# Altium footprint library PcbLib1.PcbLib: 209 footprints (part 5 of 14)
Each footprint in its own frame and in the unit in brackets; x right, y up, seen from the top. Pads: shape width x height; smd on the part's side, far side on the other; paste and mask are expansions set on the pad; w line width, h text height; cw(c..) or ccw(c..) is an arc to the next point about the centre after c.
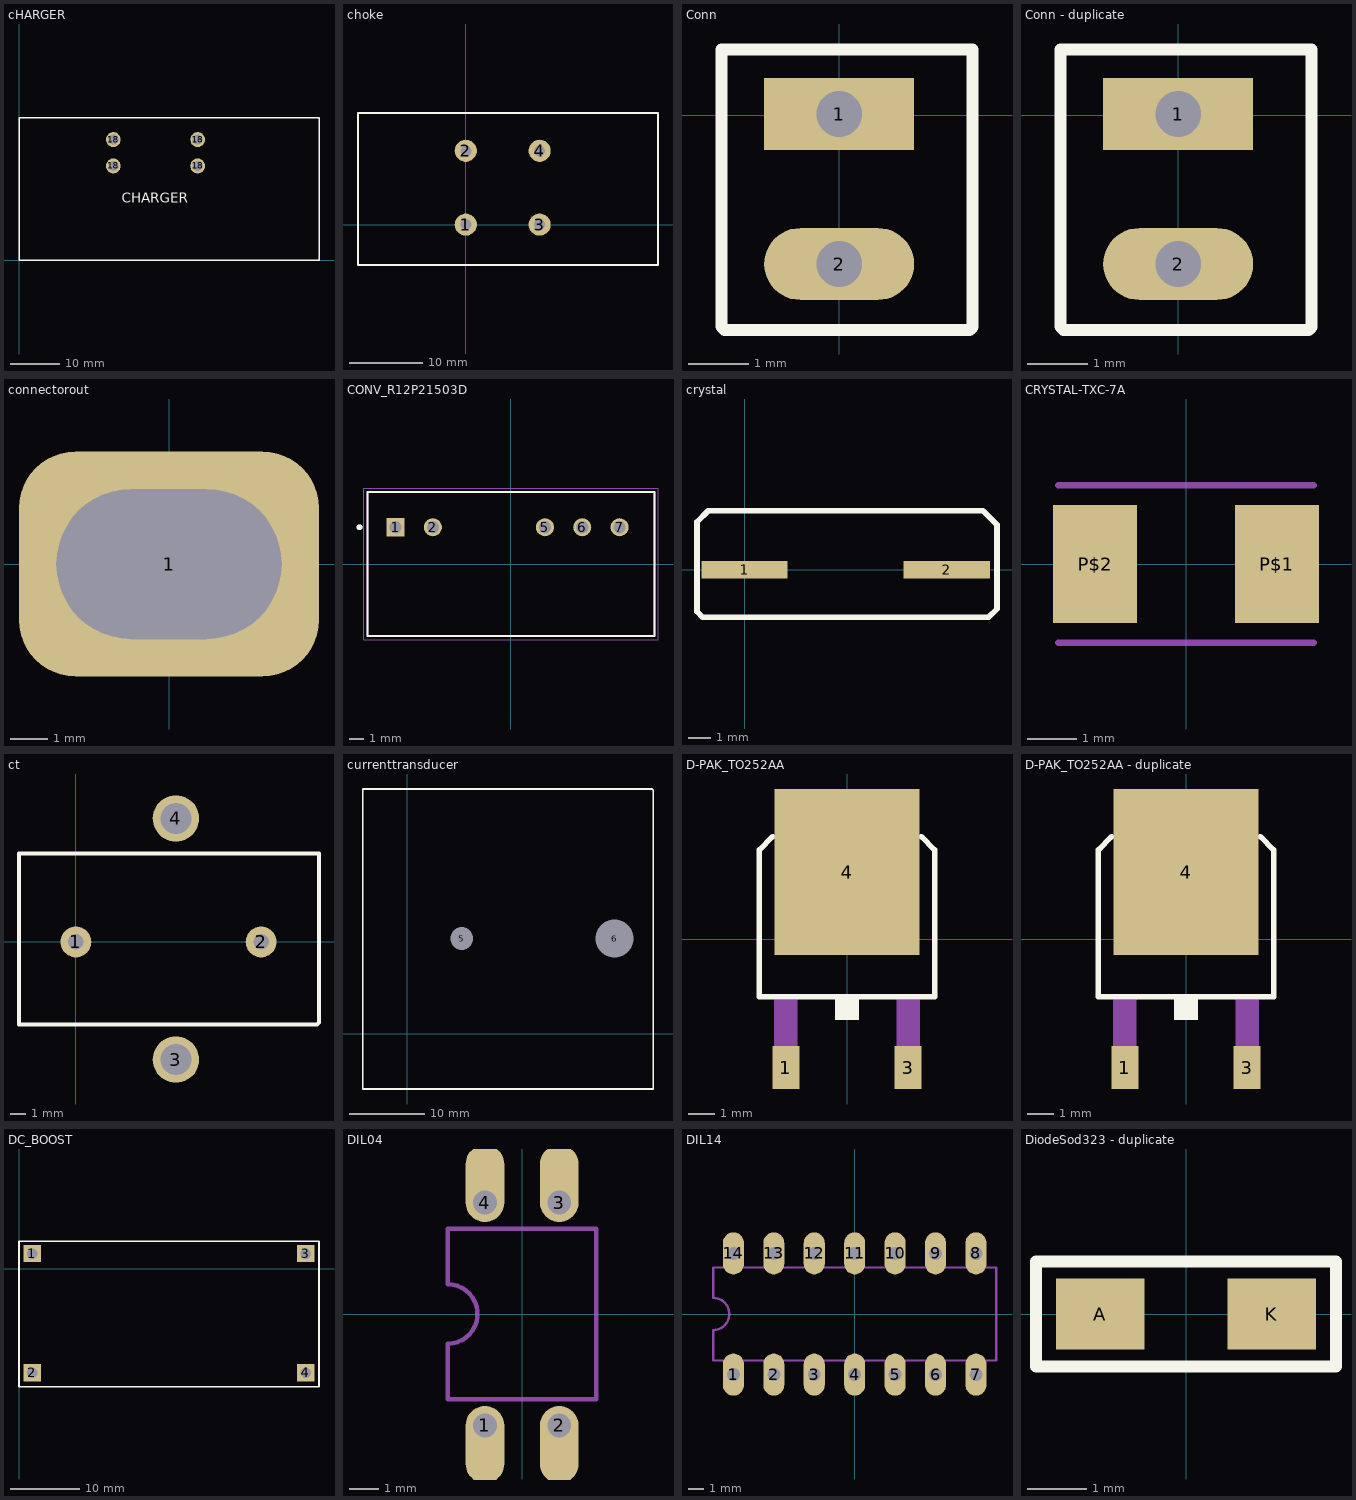
[diagram p4: the footprints below, top view; thin cyan lines are the x and y axes]

## cHARGER [mm]
pads (4):
  round 3 hole 2: 18(19,19) 18(19,24.3) 18(36,19) 18(36,24.3)
Top Overlay:
  lines w0.254: 0,0 59.944,0 60.452,0 60.452,28.702 0,28.702 0,0
  text "CHARGER" at 20.701,11.557 h2

## choke [mm]
pads (4):
  round 3 hole 1.5: 1(0,0) 2(0,10) 3(10,0) 4(10,10)
Top Overlay:
  lines w0.254: -14.605,-5.461 26.035,-5.461 26.035,15.113 -14.605,15.113 -14.605,-5.461

## Conn [mm]
pads (2):
  rect 2.5x1.2 hole 0.762 square: 1(0,0.025)
  oval 2.5x1.2 hole 0.762 square: 2(0,-2.475)
Top Overlay:
  lines w0.2: -1.965,-3.52 -1.91,-3.575 2.175,-3.575 2.225,-3.525 2.225,1.1 -1.965,1.1 -1.965,-3.52
3D body "User Library-Header1x2.STEP": height 8.15, standoff -2.83, extent -1.24,-3.74 1.3,1.34

## Conn - duplicate [mm]
pads (2):
  rect 2.5x1.2 hole 0.762 square: 1(0,0.025)
  oval 2.5x1.2 hole 0.762 square: 2(0,-2.475)
Top Overlay:
  lines w0.2: -1.965,-3.52 -1.965,1.1 2.225,1.1 2.225,-3.525 2.175,-3.575 -1.91,-3.575 -1.965,-3.52
3D body "User Library-Header1x2.STEP": height 8.15, standoff -2.83, extent -1.24,-3.74 1.3,1.34

## connectorout [mm]
pads (1):
  rrect50% 8x6 hole 4 slot 6 at 0 deg: 1(0,0)

## CONV_R12P21503D [mm]
pads (5):
  rect 1.23x1.23 hole 0.82: 1(-7.85,2.5)
  round 1.23 hole 0.82: 2(-5.31,2.5) 5(2.31,2.5) 6(4.85,2.5) 7(7.39,2.5)
Top Overlay:
  circle w0.2: c-10.3,2.5 r0.1
  lines w0.127: -9.75,-4.9 -9.75,4.9 9.75,4.9 9.75,-4.9 -9.75,-4.9
Mechanical 13:
  circle w0.2: c-10.3,2.5 r0.1
  lines w0.127: -9.75,-4.9 9.75,-4.9 9.75,4.9 -9.75,4.9 -9.75,-4.9
Mechanical 15:
  lines w0.05: -10,-5.15 -10,5.15 10,5.15 10,-5.15 -10,-5.15
3D body "R12P21503D.STEP": height 12, standoff -4.6, extent -9.75,-4.9 9.75,4.9

## crystal [mm]
pads (2):
  rect 3.9x0.8 smd: 1(0,0) 2(9.153,0)
Top Overlay:
  lines w0.254: -2.159,-1.905 -2.159,2.159 -1.651,2.667 10.795,2.667 11.43,2.032 11.43,-1.778 11.049,-2.159 -1.905,-2.159 -2.159,-1.905
3D body "User Library-SMU4.STEP": height 4.01, standoff 0.01, extent -1.669,-2.273 10.832,2.527

## CRYSTAL-TXC-7A [mm] "CRYSTAL-TXC-7A"
pads (2):
  rect 1.7x2.4 smd: P$1(1.85,0) P$2(-1.85,0)
Bottom 3D Body:
  lines w0.127: -2.6,-1.6 2.6,-1.6 ; -2.6,1.6 2.6,1.6

## ct [mm]
pads (4):
  round 2 hole 1: 1(0,0) 2(12,0)
  round 3 hole 2: 3(6.477,-7.62) 4(6.477,8.001)
Top Overlay:
  lines w0.254: -3.683,3.556 -3.683,0 ; -3.683,0 -3.683,5.715 15.748,5.715 15.748,4.191 15.748,0 15.748,-5.207 15.621,-5.334 -3.683,-5.334 -3.683,0

## currenttransducer [mm]
pads (2):
  round 1.524 hole 3: 5(7.225,12.575)
  round 1.524 hole 5: 6(27.425,12.575)
Top Overlay:
  lines w0.254: -5.874,-7.325 -5.874,32.35 32.375,32.35 32.55,32.175 32.55,0.175 32.55,-7.325 -5.874,-7.325
3D body "HASS_XXX-P.stp": height 30.01, standoff -2.99, extent -5.874,-7.325 32.425,32.675

## D-PAK_TO252AA [mm] "D-PAK_TO252AA"
pads (3):
  rect 1x1.6 smd: 1(-2.28,-4.8) 3(2.28,-4.8)
  rect 5.4x6.2 smd: 4(0,2.5)
Top Overlay:
  region: -0.432,-3.023 -0.432,-2.261 0.432,-2.261 0.432,-3.023
  lines w0.203: -2.775,3.825 -3.275,3.325 -3.275,-2.15 3.275,-2.15 3.275,3.325 2.775,3.825
Bottom Assembly:
  region: -2.565,3.937 -2.565,4.648 -2.108,5.105 2.108,5.105 2.565,4.648 2.565,3.937
  region: 1.854,-5.156 1.854,-2.261 2.718,-2.261 2.718,-5.156
  region: -2.718,-5.156 -2.718,-2.261 -1.854,-2.261 -1.854,-5.156
  lines w0.203: -2.565,3.937 2.565,3.937 2.565,4.648 2.108,5.105 -2.108,5.105 -2.565,4.648 -2.565,3.937
3D body "TO252 Gehäuse.step": height 2.3, standoff -0.05, extent -3.35,-4.825 3.15,3.875

## D-PAK_TO252AA - duplicate [mm] "D-PAK_TO252AA"
pads (3):
  rect 1x1.6 smd: 1(-2.28,-4.8) 3(2.28,-4.8)
  rect 5.4x6.2 smd: 4(0,2.5)
Top Overlay:
  region: -0.432,-3.023 -0.432,-2.261 0.432,-2.261 0.432,-3.023
  lines w0.203: -2.775,3.825 -3.275,3.325 -3.275,-2.15 3.275,-2.15 3.275,3.325 2.775,3.825
Bottom Assembly:
  region: -2.565,3.937 -2.565,4.648 -2.108,5.105 2.108,5.105 2.565,4.648 2.565,3.937
  region: 1.854,-5.156 1.854,-2.261 2.718,-2.261 2.718,-5.156
  region: -2.718,-5.156 -2.718,-2.261 -1.854,-2.261 -1.854,-5.156
  lines w0.203: -2.565,3.937 2.565,3.937 2.565,4.648 2.108,5.105 -2.108,5.105 -2.565,4.648 -2.565,3.937
3D body "TO252 Gehäuse.step": height 2.3, standoff -0.05, extent -3.35,-4.825 3.15,3.875

## DC_BOOST [mm]
pads (4):
  rect 2.5x2.5 hole 1.5: 1(1.905,2.159) 2(1.905,-14.986) 3(41.275,2.159) 4(41.275,-14.986)
Top Overlay:
  lines w0.254: -0.002,-17.017 -0.002,3.937 43.178,3.937 43.178,-17.017 ; 0,-17.018 43.18,-17.018
3D body "XL6009.stp": height 12.76, standoff -5.2, extent -0.127,-17.018 43.053,4.064

## DIL04 [mil] "DIL04"
pads (4):
  oval 52x104 / inner round 0 / far side oval 52x104 hole 32 copper offset 0,-26: 1(-50,-150) 2(50,-150)
  oval 52x104 / inner round 0 / far side oval 52x104 hole 32 copper offset 0,26: 3(50,150) 4(-50,150)
Bottom 3D Body:
  lines w6: -100,-115 -100,-40 ccw(c-100,0) -100,40 -100,115 100,115 100,-115 -100,-115
3D body: height 50, standoff 0, extent -76.22,123.78 -23.78,228.22
3D body: height 50, standoff 0, extent 23.78,123.78 76.22,228.22
3D body: height 50, standoff 0, extent 23.78,-228.22 76.22,-123.78
3D body: height 50, standoff 0, extent -76.22,-228.22 -23.78,-123.78

## DIL14 [mil] "DIL14"
pads (14):
  oval 52x104 / inner round 0 / far side oval 52x104 hole 32: 1(-300,-150) 2(-200,-150) 3(-100,-150) 4(0,-150) 5(100,-150) 6(200,-150) 7(300,-150) 8(300,150) 9(200,150) 10(100,150) 11(0,150) 12(-100,150) 13(-200,150) 14(-300,150)
Bottom 3D Body:
  lines w6: -350,-115 350,-115 350,115 -350,115 -350,40 cw(c-350,0) -350,-40 -350,-115
3D body: height 50, standoff 0, extent -326.22,-202.22 -273.78,-97.78
3D body: height 50, standoff 0, extent -226.22,-202.22 -173.78,-97.78
3D body: height 50, standoff 0, extent 273.78,-202.22 326.22,-97.78
3D body: height 50, standoff 0, extent 273.78,97.78 326.22,202.22
3D body: height 50, standoff 0, extent -126.22,-202.22 -73.78,-97.78
3D body: height 50, standoff 0, extent -26.22,-202.22 26.22,-97.78
3D body: height 50, standoff 0, extent 173.78,-202.22 226.22,-97.78
3D body: height 50, standoff 0, extent 73.78,-202.22 126.22,-97.78
3D body: height 50, standoff 0, extent 173.78,97.78 226.22,202.22
3D body: height 50, standoff 0, extent 73.78,97.78 126.22,202.22
3D body: height 50, standoff 0, extent -26.22,97.78 26.22,202.22
3D body: height 50, standoff 0, extent -126.22,97.78 -73.78,202.22
3D body: height 50, standoff 0, extent -226.22,97.78 -173.78,202.22
3D body: height 50, standoff 0, extent -326.22,97.78 -273.78,202.22

## DiodeSod323 - duplicate [mm]
pads (2):
  rect 1.5x1.2 smd: A(-1.45,0) K(1.45,0)
Top Overlay:
  lines w0.2: -2.54,-0.635 -2.54,-0.889 ; -2.54,-0.889 2.54,-0.889 2.54,0.889 -2.54,0.889 -2.54,-0.46 -2.54,-0.889
3D body "SOD-323.STEP": height 1.16, standoff 0.01, extent -1.35,-0.724 1.35,0.723